# Altium footprint library ConnectorsTDH.PcbLib: 194 footprints (part 12 of 13)
Each footprint in its own frame and in the unit in brackets; x right, y up, seen from the top. Pads: shape width x height; smd on the part's side, far side on the other; paste and mask are expansions set on the pad; w line width, h text height; cw(c..) or ccw(c..) is an arc to the next point about the centre after c.
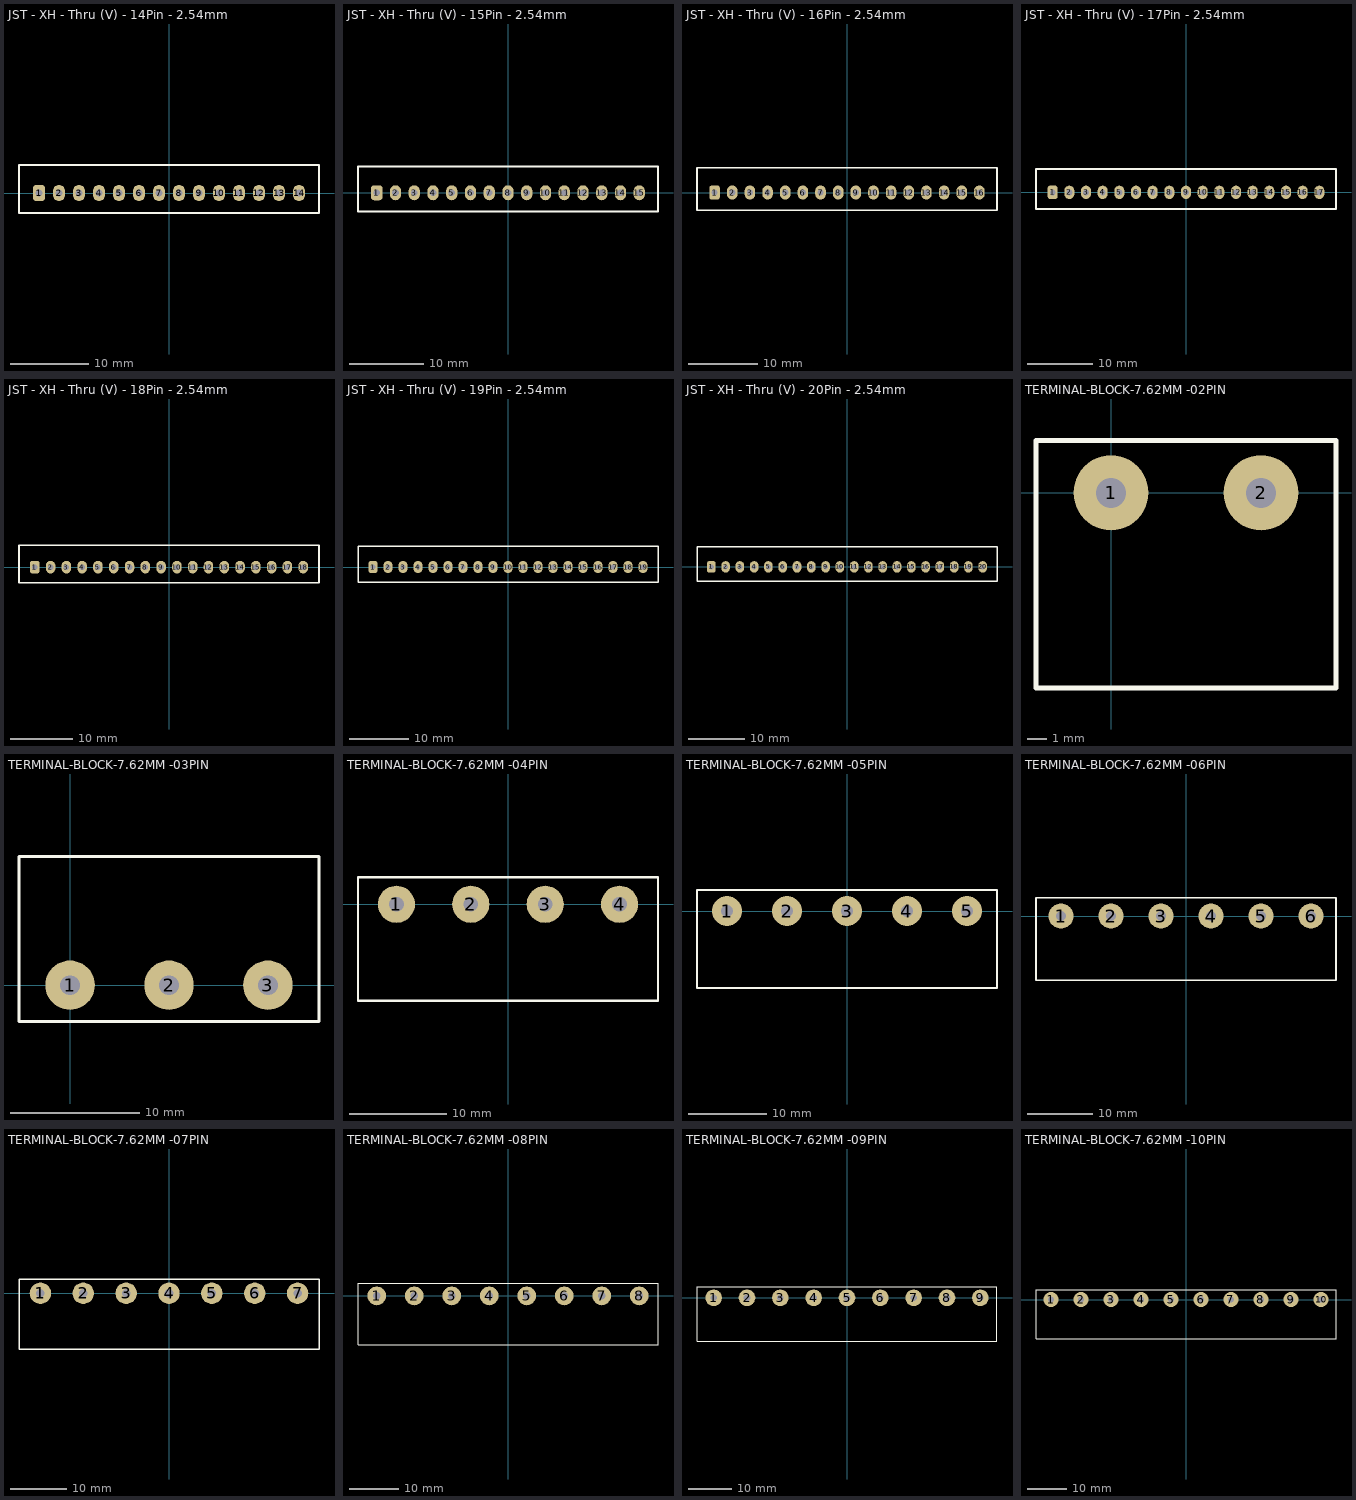
[diagram p11: the footprints below, top view; thin cyan lines are the x and y axes]

## JST - XH - Thru (V) - 14Pin - 2.54mm [mil]
pads (14):
  rrect50% 60x80 hole 35: 1(-650,0)
  oval 60x80 hole 35: 2(-550,0) 3(-450,0) 4(-350,0) 5(-250,0) 6(-150,0) 7(-50,0) 8(50,0) 9(150,0) 10(250,0) 11(350,0) 12(450,0) 13(550,0) 14(650,0)
Top Overlay:
  lines w10: -750,-100 -750,140 750,140 750,-100 -750,-100
3D body "JST - XH - Thru (V) - 14Pin - 2.54mm.stp": height 284, standoff -118, extent -741.99,-97.99 742.01,132.01

## JST - XH - Thru (V) - 15Pin - 2.54mm [mil]
pads (15):
  rrect50% 60x80 hole 35: 1(-700,0)
  oval 60x80 hole 35: 2(-600,0) 3(-500,0) 4(-400,0) 5(-300,0) 6(-200,0) 7(-100,0) 8(0,0) 9(100,0) 10(200,0) 11(300,0) 12(400,0) 13(500,0) 14(600,0) 15(700,0)
Top Overlay:
  lines w10: -800,-100 -800,140 800,140 800,-100 -800,-100
3D body "JST - XH - Thru (V) - 15Pin - 2.54mm.stp": height 284, standoff -118, extent -791.99,-97.99 792.01,132.01

## JST - XH - Thru (V) - 16Pin - 2.54mm [mil]
pads (16):
  rrect50% 60x80 hole 35: 1(-750,0)
  oval 60x80 hole 35: 2(-650,0) 3(-550,0) 4(-450,0) 5(-350,0) 6(-250,0) 7(-150,0) 8(-50,0) 9(50,0) 10(150,0) 11(250,0) 12(350,0) 13(450,0) 14(550,0) 15(650,0) 16(750,0)
Top Overlay:
  lines w10: -850,-100 850,-100 850,140 -850,140 -850,-100
3D body "JST - XH - Thru (V) - 16Pin - 2.54mm.stp": height 284, standoff -118, extent -841.99,-97.99 842.01,132.01

## JST - XH - Thru (V) - 17Pin - 2.54mm [mil]
pads (17):
  rrect50% 60x80 hole 35: 1(-800,0)
  oval 60x80 hole 35: 2(-700,0) 3(-600,0) 4(-500,0) 5(-400,0) 6(-300,0) 7(-200,0) 8(-100,0) 9(0,0) 10(100,0) 11(200,0) 12(300,0) 13(400,0) 14(500,0) 15(600,0) 16(700,0) 17(800,0)
Top Overlay:
  lines w10: -900,-100 -900,140 900,140 900,-100 -900,-100
3D body "JST - XH - Thru (V) - 17Pin - 2.54mm.stp": height 284, standoff -118, extent -891.99,-97.99 892.01,132.01

## JST - XH - Thru (V) - 18Pin - 2.54mm [mil]
pads (18):
  rrect50% 60x80 hole 35: 1(-850,0)
  oval 60x80 hole 35: 2(-750,0) 3(-650,0) 4(-550,0) 5(-450,0) 6(-350,0) 7(-250,0) 8(-150,0) 9(-50,0) 10(50,0) 11(150,0) 12(250,0) 13(350,0) 14(450,0) 15(550,0) 16(650,0) 17(750,0) 18(850,0)
Top Overlay:
  lines w10: -950,-100 -950,140 950,140 950,-100 -950,-100
3D body "JST - XH - Thru (V) - 18Pin - 2.54mm.stp": height 284, standoff -118, extent -941.99,-97.99 942.01,132.01

## JST - XH - Thru (V) - 19Pin - 2.54mm [mil]
pads (19):
  rrect50% 60x80 hole 35: 1(-900,0)
  oval 60x80 hole 35: 2(-800,0) 3(-700,0) 4(-600,0) 5(-500,0) 6(-400,0) 7(-300,0) 8(-200,0) 9(-100,0) 10(0,0) 11(100,0) 12(200,0) 13(300,0) 14(400,0) 15(500,0) 16(600,0) 17(700,0) 18(800,0) 19(900,0)
Top Overlay:
  lines w10: -1000,-100 1000,-100 1000,140 -1000,140 -1000,-100
3D body "JST - XH - Thru (V) - 19Pin - 2.54mm.stp": height 284, standoff -118, extent -991.99,-97.99 992.01,132.01

## JST - XH - Thru (V) - 20Pin - 2.54mm [mil]
pads (20):
  rrect50% 60x80 hole 35: 1(-950,0)
  oval 60x80 hole 35: 2(-850,0) 3(-750,0) 4(-650,0) 5(-550,0) 6(-450,0) 7(-350,0) 8(-250,0) 9(-150,0) 10(-50,0) 11(50,0) 12(150,0) 13(250,0) 14(350,0) 15(450,0) 16(550,0) 17(650,0) 18(750,0) 19(850,0) 20(950,0)
Top Overlay:
  lines w10: 1050,-90 1050,140 -1050,140 -1050,-100 1050,-100 1050,-35.69
3D body "JST - XH - Thru (V) - 20Pin - 2.54mm.stp": height 284, standoff -118, extent -1041.99,-97.99 1042.01,132.01

## TERMINAL-BLOCK-7.62MM -02PIN [mil]
pads (2):
  round 150 hole 60: 1(0,0) 2(300,0)
Top Overlay:
  lines w10: -150,-390 450,-390 450,105 -150,105 -150,-390
3D body "BR-76231C-02.stp": height 409.45, standoff -157.48, extent -150,-386.07 450,106.06

## TERMINAL-BLOCK-7.62MM -03PIN [mil]
pads (3):
  round 150 hole 60: 1(0,0) 2(300,0) 3(600,0)
Top Overlay:
  lines w10: -155,-110 755,-110 755,390 -155,390 -155,-110
3D body "BR-76231C-03.stp": height 409.45, standoff -157.48, extent -150,-106.06 750,386.07

## TERMINAL-BLOCK-7.62MM -04PIN [mil]
pads (4):
  round 150 hole 60: 1(-450,0) 2(-150,0) 3(150,0) 4(450,0)
Top Overlay:
  lines w10: -605,-390 605,-390 605,110 -605,110 -605,-390
3D body "BR-76231C-04.stp": height 409.45, standoff -157.48, extent -600,-386.07 600,106.06

## TERMINAL-BLOCK-7.62MM -05PIN [mil]
pads (5):
  round 150 hole 60: 1(-600,0) 2(-300,0) 3(0,0) 4(300,0) 5(600,0)
Top Overlay:
  lines w10: -750,-385 750,-385 750,105 -750,105 -750,-385
3D body "BR-76231C-05.stp": height 409.45, standoff -157.48, extent -750,-386.07 750,106.06

## TERMINAL-BLOCK-7.62MM -06PIN [mil]
pads (6):
  round 150 hole 60: 1(-750,0) 2(-450,0) 3(-150,0) 4(150,0) 5(450,0) 6(750,0)
Top Overlay:
  lines w10: -900,-385 900,-385 900,110 -900,110 -900,-385
3D body "BR-76231C-06.stp": height 409.45, standoff -157.48, extent -900,-386.07 900,106.06

## TERMINAL-BLOCK-7.62MM -07PIN [mil]
pads (7):
  round 150 hole 60: 1(-900,0) 2(-600,0) 3(-300,0) 4(0,0) 5(300,0) 6(600,0) 7(900,0)
Top Overlay:
  lines w10: -1050,-390 1050,-390 1050,100 -1050,100 -1050,-390
3D body "BR-76231C-07.stp": height 409.45, standoff -157.48, extent -1050,-391.07 1050,101.06

## TERMINAL-BLOCK-7.62MM -08PIN [mil]
pads (8):
  round 150 hole 60: 1(-1050,0) 2(-750,0) 3(-450,0) 4(-150,0) 5(150,0) 6(450,0) 7(750,0) 8(1050,0)
Top Overlay:
  lines w10: -1200,-390 1200,-390 1200,100 -1200,100 -1200,-390
3D body "BR-76231C-08.stp": height 409.45, standoff -157.48, extent -1200,-391.07 1200,101.06

## TERMINAL-BLOCK-7.62MM -09PIN [mil]
pads (9):
  round 150 hole 60: 1(-1200,0) 2(-900,0) 3(-600,0) 4(-300,0) 5(0,0) 6(300,0) 7(600,0) 8(900,0) 9(1200,0)
Top Overlay:
  lines w10: -1350,-390 1350,-390 1350,100 -1350,100 -1350,-390
3D body "BR-76231C-09.stp": height 409.45, standoff -157.48, extent -1350,-391.07 1350,101.06

## TERMINAL-BLOCK-7.62MM -10PIN [mil]
pads (10):
  round 150 hole 60: 1(-1350,0) 2(-1050,0) 3(-750,0) 4(-450,0) 5(-150,0) 6(150,0) 7(450,0) 8(750,0) 9(1050,0) 10(1350,0)
Top Overlay:
  lines w10: -1500,-390 1500,-390 1500,100 -1500,100 -1500,-390
3D body "BR-76231C-10.stp": height 409.45, standoff -157.48, extent -1500,-391.07 1500,101.06